# Altium footprint library ICs And Semiconductors SMD.PcbLib: 943 footprints (part 12 of 60)
Each footprint in its own frame and in the unit in brackets; x right, y up, seen from the top. Pads: shape width x height; smd on the part's side, far side on the other; paste and mask are expansions set on the pad; w line width, h text height; cw(c..) or ccw(c..) is an arc to the next point about the centre after c.
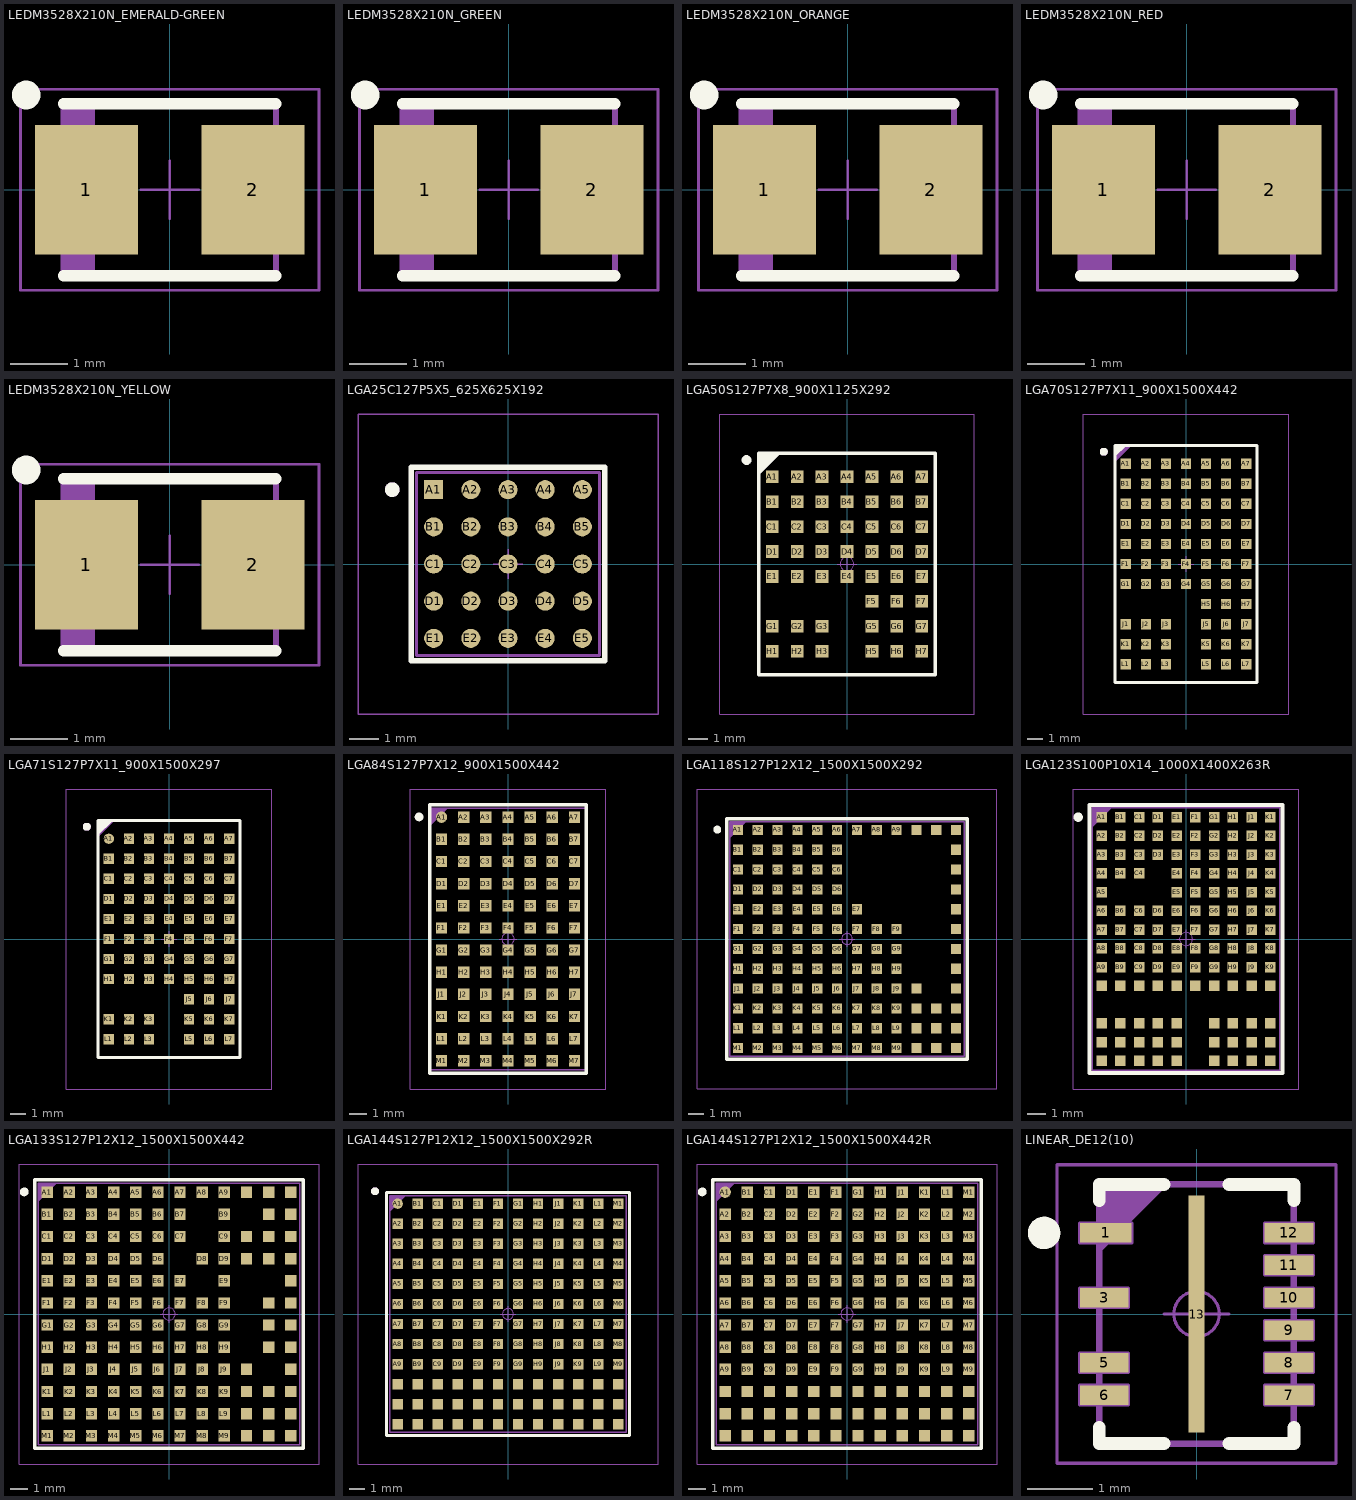
[diagram p11: the footprints below, top view; thin cyan lines are the x and y axes]

## LEDM3528X210N_EMERALD-GREEN [mm] "Molded SMD Emerald Green LED, 2-Leads, Body 3.5x2.8mm, IPC Medium Density"
height 2.1
pads (2):
  rect 1.8x2.25 smd: 1(-1.45,0) 2(1.45,0)
Top Overlay:
  circle w0.25: c-2.5,1.65 r0.125
  lines w0.2: -1.85,-1.5 1.85,-1.5 ; -1.85,1.5 1.85,1.5
Mechanical 14:
  lines w0.1: -1.8,-1.5 -1.8,1.5 ; -1.725,-1.5 -1.725,1.5 ; -1.65,-1.5 -1.65,1.5 ; -1.575,-1.5 -1.575,1.5 ; -1.5,-1.5 -1.5,1.5 ; -1.425,-1.5 -1.425,1.5 ; -1.35,-1.5 -1.35,1.5 ; -1.85,-1.5 -1.85,1.5 1.85,1.5 1.85,-1.5 -1.85,-1.5
Mechanical 15:
  lines w0.05: -0.5,0 0.5,0 ; 0,-0.5 0,0.5 ; -2.6,-1.75 -2.6,1.75 2.6,1.75 2.6,-1.75 -2.6,-1.75
3D body "LEDM3528X210N_EMERALD-GREEN.stp": height 2.1, standoff 0, extent -1.85,-1.5 1.85,1.5

## LEDM3528X210N_GREEN [mm] "Molded SMD Green LED, 2-Leads, Body 3.5x2.8mm, IPC Medium Density"
height 2.1
pads (2):
  rect 1.8x2.25 smd: 1(-1.45,0) 2(1.45,0)
Top Overlay:
  circle w0.25: c-2.5,1.65 r0.125
  lines w0.2: -1.85,-1.5 1.85,-1.5 ; -1.85,1.5 1.85,1.5
Mechanical 14:
  lines w0.1: -1.8,-1.5 -1.8,1.5 ; -1.725,-1.5 -1.725,1.5 ; -1.65,-1.5 -1.65,1.5 ; -1.575,-1.5 -1.575,1.5 ; -1.5,-1.5 -1.5,1.5 ; -1.425,-1.5 -1.425,1.5 ; -1.35,-1.5 -1.35,1.5 ; -1.85,-1.5 -1.85,1.5 1.85,1.5 1.85,-1.5 -1.85,-1.5
Mechanical 15:
  lines w0.05: -0.5,0 0.5,0 ; 0,-0.5 0,0.5 ; -2.6,-1.75 -2.6,1.75 2.6,1.75 2.6,-1.75 -2.6,-1.75
3D body "LEDM3528X210N_GREEN.stp": height 2.1, standoff 0, extent -1.85,-1.5 1.85,1.5

## LEDM3528X210N_ORANGE [mm] "Molded SMD ORANGE LED, 2-Leads, Body 3.5x2.8mm, IPC Medium Density"
height 2.1
pads (2):
  rect 1.8x2.25 smd: 1(-1.45,0) 2(1.45,0)
Top Overlay:
  circle w0.25: c-2.5,1.65 r0.125
  lines w0.2: -1.85,-1.5 1.85,-1.5 ; -1.85,1.5 1.85,1.5
Mechanical 14:
  lines w0.1: -1.8,-1.5 -1.8,1.5 ; -1.725,-1.5 -1.725,1.5 ; -1.65,-1.5 -1.65,1.5 ; -1.575,-1.5 -1.575,1.5 ; -1.5,-1.5 -1.5,1.5 ; -1.425,-1.5 -1.425,1.5 ; -1.35,-1.5 -1.35,1.5 ; -1.85,-1.5 -1.85,1.5 1.85,1.5 1.85,-1.5 -1.85,-1.5
Mechanical 15:
  lines w0.05: -0.5,0 0.5,0 ; 0,-0.5 0,0.5 ; -2.6,-1.75 -2.6,1.75 2.6,1.75 2.6,-1.75 -2.6,-1.75
3D body "LEDM3528X210N_ORANGE.stp": height 2.1, standoff 0, extent -1.85,-1.5 1.85,1.5

## LEDM3528X210N_RED [mm] "Molded SMD RED LED, 2-Leads, Body 3.5x2.8mm, IPC Medium Density"
height 2.1
pads (2):
  rect 1.8x2.25 smd: 1(-1.45,0) 2(1.45,0)
Top Overlay:
  circle w0.25: c-2.5,1.65 r0.125
  lines w0.2: -1.85,-1.5 1.85,-1.5 ; -1.85,1.5 1.85,1.5
Mechanical 14:
  lines w0.1: -1.8,-1.5 -1.8,1.5 ; -1.725,-1.5 -1.725,1.5 ; -1.65,-1.5 -1.65,1.5 ; -1.575,-1.5 -1.575,1.5 ; -1.5,-1.5 -1.5,1.5 ; -1.425,-1.5 -1.425,1.5 ; -1.35,-1.5 -1.35,1.5 ; -1.85,-1.5 1.85,-1.5 1.85,1.5 -1.85,1.5 -1.85,-1.5
Mechanical 15:
  lines w0.05: -0.5,0 0.5,0 ; 0,-0.5 0,0.5 ; -2.6,-1.75 2.6,-1.75 2.6,1.75 -2.6,1.75 -2.6,-1.75
3D body "LEDM3528X210N_RED.stp": height 2.1, standoff 0, extent -1.85,-1.5 1.85,1.5

## LEDM3528X210N_YELLOW [mm] "Molded SMD YELLOW LED, 2-Leads, Body 3.5x2.8mm, IPC Medium Density"
height 2.1
pads (2):
  rect 1.8x2.25 smd: 1(-1.45,0) 2(1.45,0)
Top Overlay:
  circle w0.25: c-2.5,1.65 r0.125
  lines w0.2: -1.85,-1.5 1.85,-1.5 ; -1.85,1.5 1.85,1.5
Mechanical 14:
  lines w0.1: -1.8,-1.5 -1.8,1.5 ; -1.725,-1.5 -1.725,1.5 ; -1.65,-1.5 -1.65,1.5 ; -1.575,-1.5 -1.575,1.5 ; -1.5,-1.5 -1.5,1.5 ; -1.425,-1.5 -1.425,1.5 ; -1.35,-1.5 -1.35,1.5 ; -1.85,-1.5 -1.85,1.5 1.85,1.5 1.85,-1.5 -1.85,-1.5
Mechanical 15:
  lines w0.05: -0.5,0 0.5,0 ; 0,-0.5 0,0.5 ; -2.6,-1.75 -2.6,1.75 2.6,1.75 2.6,-1.75 -2.6,-1.75
3D body "LEDM3528X210N_YELLOW.stp": height 2.1, standoff 0, extent -1.85,-1.5 1.85,1.5

## LGA25C127P5X5_625X625X192 [mm] "LGA, 1.27mm Pitch, Square; 25 Pin, 5 Columns X 5 Rows, 6.25mm X 6.25mm X 1.92mm H"
height 1.92
pads (25):
  rect 0.65x0.65 smd: A1(-2.54,2.54)
  round 0.65 smd: A2(-1.27,2.54) A3(0,2.54) A4(1.27,2.54) A5(2.54,2.54) B1(-2.54,1.27) B2(-1.27,1.27) B3(0,1.27) B4(1.27,1.27) B5(2.54,1.27) C1(-2.54,0) C2(-1.27,0) C3(0,0) C4(1.27,0) C5(2.54,0) D1(-2.54,-1.27) D2(-1.27,-1.27) D3(0,-1.27) D4(1.27,-1.27) D5(2.54,-1.27) E1(-2.54,-2.54) E2(-1.27,-2.54) E3(0,-2.54) E4(1.27,-2.54) E5(2.54,-2.54)
Top Overlay:
  circle w0.25: c-3.955,2.54 r0.125
  lines w0.2: -3.305,-3.305 3.305,-3.305 3.305,3.305 -3.305,3.305 -3.305,-3.305
Mechanical 14:
  circle w0.25: c-3.955,2.54 r0.125
  lines w0.1: -3.125,-3.125 -3.125,3.125 3.125,3.125 3.125,-3.125 -3.125,-3.125
  text "1" at -2.6,3.5 h0.4
  text "2" at -1.4,3.5 h0.4
  text "3" at -0.14,3.5 h0.4
  text "4" at 1.12,3.5 h0.4
  text "5" at 2.4,3.5 h0.4
  text "E" at -3.8,-2.74 h0.4
  text "D" at -3.8,-1.47 h0.4
  text "C" at -3.8,-0.2 h0.4
  text "B" at -3.8,1.07 h0.4
  text "A" at -3.8,2.34 h0.4
Mechanical 15:
  lines w0.05: -0.5,0 0.5,0 ; 0,-0.5 0,0.5 ; -5.125,-5.125 -5.125,5.125 5.125,5.125 5.125,-5.125 -5.125,-5.125
3D body "LGA25C127P5X5_625X625X192.stp": height 1.92, standoff 0, extent -3.125,-3.125 3.125,3.125

## LGA50S127P7X8_900X1125X292 [mm] "LGA, 1.27mm pitch,rect.; 50 pin,7 columns X 8 rows, 9.00mm X 11.25mm X 2.92mm H"
height 2.92
pads (50):
  rect 0.65x0.65 smd: A1(-3.81,4.445) A2(-2.54,4.445) A3(-1.27,4.445) A4(0,4.445) A5(1.27,4.445) A6(2.54,4.445) A7(3.81,4.445) B1(-3.81,3.175) B2(-2.54,3.175) B3(-1.27,3.175) B4(0,3.175) B5(1.27,3.175) B6(2.54,3.175) B7(3.81,3.175) C1(-3.81,1.905) C2(-2.54,1.905) C3(-1.27,1.905) C4(0,1.905) C5(1.27,1.905) C6(2.54,1.905) C7(3.81,1.905) D1(-3.81,0.635) D2(-2.54,0.635) D3(-1.27,0.635) D4(0,0.635) D5(1.27,0.635) D6(2.54,0.635) D7(3.81,0.635) E1(-3.81,-0.635) E2(-2.54,-0.635) E3(-1.27,-0.635) E4(0,-0.635) E5(1.27,-0.635) E6(2.54,-0.635) E7(3.81,-0.635) F5(1.27,-1.905) F6(2.54,-1.905) F7(3.81,-1.905) G1(-3.81,-3.175) G2(-2.54,-3.175) G3(-1.27,-3.175) G5(1.27,-3.175) G6(2.54,-3.175) G7(3.81,-3.175) H1(-3.81,-4.445) H2(-2.54,-4.445) H3(-1.27,-4.445) H5(1.27,-4.445) H6(2.54,-4.445) H7(3.81,-4.445)
Top Overlay:
  circle w0.25: c-5.125,5.3 r0.125
  lines w0.2: -4.5,4.65 -3.5,5.65 ; -4.5,4.85 -3.7,5.65 ; -4.5,5.05 -3.9,5.65 ; -4.5,5.25 -4.1,5.65 ; -4.5,5.45 -4.3,5.65 ; -4.5,-5.65 -4.5,5.65 4.5,5.65 4.5,-5.65 -4.5,-5.65
Mechanical 14:
  lines w0.1: -4.5,4.65 -3.5,5.65 ; -4.5,4.75 -3.6,5.65 ; -4.5,4.85 -3.7,5.65 ; -4.5,4.95 -3.8,5.65 ; -4.5,5.05 -3.9,5.65 ; -4.5,5.15 -4,5.65 ; -4.5,5.25 -4.1,5.65 ; -4.5,5.35 -4.2,5.65 ; -4.5,5.45 -4.3,5.65 ; -4.5,5.55 -4.4,5.65 ; -4.5,-5.625 -4.5,5.625 4.5,5.625 4.5,-5.625 -4.5,-5.625
  text "6" at 2.477,5.988 h0.4
  text "5" at 1.207,5.988 h0.4
  text "4" at -0.063,5.988 h0.4
  text "7" at 3.747,5.988 h0.4
  text "3" at -1.333,5.988 h0.4
  text "2" at -2.603,5.988 h0.4
  text "1" at -3.873,5.988 h0.4
  text "A" at -5.016,4.337 h0.4
  text "B" at -5.016,3.067 h0.4
  text "C" at -5.016,1.797 h0.4
  text "D" at -5.016,0.527 h0.4
  text "E" at -5.016,-0.743 h0.4
  text "F" at -5.016,-2.013 h0.4
  text "G" at -5.016,-3.283 h0.4
  text "H" at -5.016,-4.553 h0.4
Mechanical 15:
  circle w0.05: c0,0 r0.35
  lines w0.05: -0.5,0 0.5,0 ; 0,-0.5 0,0.5 ; -6.5,-7.65 -6.5,7.65 6.5,7.65 6.5,-7.65 -6.5,-7.65
3D body "LGA50S127P7X8_900X1125X292.stp": height 2.92, standoff 0, extent -4.5,-5.625 4.5,5.625

## LGA70S127P7X11_900X1500X442 [mm] "LGA, 1.27mm pitch, rect., 70 pin, 7 columns X 11 rows, 9mm X 15mm X 4.42mm H"
height 4.42
pads (70):
  rect 0.65x0.65 smd: A1(-3.81,6.35) A2(-2.54,6.35) A3(-1.27,6.35) A4(0,6.35) A5(1.27,6.35) A6(2.54,6.35) A7(3.81,6.35) B1(-3.81,5.08) B2(-2.54,5.08) B3(-1.27,5.08) B4(0,5.08) B5(1.27,5.08) B6(2.54,5.08) B7(3.81,5.08) C1(-3.81,3.81) C2(-2.54,3.81) C3(-1.27,3.81) C4(0,3.81) C5(1.27,3.81) C6(2.54,3.81) C7(3.81,3.81) D1(-3.81,2.54) D2(-2.54,2.54) D3(-1.27,2.54) D4(0,2.54) D5(1.27,2.54) D6(2.54,2.54) D7(3.81,2.54) E1(-3.81,1.27) E2(-2.54,1.27) E3(-1.27,1.27) E4(0,1.27) E5(1.27,1.27) E6(2.54,1.27) E7(3.81,1.27) F1(-3.81,0) F2(-2.54,0) F3(-1.27,0) F4(0,0) F5(1.27,0) F6(2.54,0) F7(3.81,0) G1(-3.81,-1.27) G2(-2.54,-1.27) G3(-1.27,-1.27) G4(0,-1.27) G5(1.27,-1.27) G6(2.54,-1.27) G7(3.81,-1.27) H5(1.27,-2.54) H6(2.54,-2.54) H7(3.81,-2.54) J1(-3.81,-3.81) J2(-2.54,-3.81) J3(-1.27,-3.81) J5(1.27,-3.81) J6(2.54,-3.81) J7(3.81,-3.81) K1(-3.81,-5.08) K2(-2.54,-5.08) K3(-1.27,-5.08) K5(1.27,-5.08) K6(2.54,-5.08) K7(3.81,-5.08) L1(-3.81,-6.35) L2(-2.54,-6.35) L3(-1.27,-6.35) L5(1.27,-6.35) L6(2.54,-6.35) L7(3.81,-6.35)
Top Overlay:
  circle w0.25: c-5.205,7.112 r0.125
  lines w0.2: -4.5,6.9 -3.9,7.5 ; -4.5,7.1 -4.1,7.5 ; -4.5,7.3 -4.3,7.5 ; -4.5,-7.5 4.5,-7.5 4.5,7.5 -4.5,7.5 -4.5,-7.5
Mechanical 14:
  circle w0.25: c-5.205,7.112 r0.125
  lines w0.1: -4.5,6.5 -3.5,7.5 ; -4.5,6.6 -3.6,7.5 ; -4.5,6.7 -3.7,7.5 ; -4.5,6.8 -3.8,7.5 ; -4.5,6.9 -3.9,7.5 ; -4.5,7 -4,7.5 ; -4.5,7.1 -4.1,7.5 ; -4.5,7.2 -4.2,7.5 ; -4.5,7.3 -4.3,7.5 ; -4.5,7.4 -4.4,7.5 ; -4.5,-7.5 -4.5,7.5 4.5,7.5 4.5,-7.5 -4.5,-7.5
  text "6" at 2.413,7.874 h0.4
  text "5" at 1.143,7.874 h0.4
  text "4" at -0.127,7.874 h0.4
  text "7" at 3.683,7.874 h0.4
  text "3" at -1.397,7.874 h0.4
  text "2" at -2.667,7.874 h0.4
  text "1" at -3.937,7.874 h0.4
  text "J" at -5.08,-3.937 h0.4
  text "A" at -5.08,6.223 h0.4
  text "B" at -5.08,4.953 h0.4
  text "C" at -5.08,3.683 h0.4
  text "D" at -5.08,2.413 h0.4
  text "E" at -5.08,1.143 h0.4
  text "F" at -5.08,-0.127 h0.4
  text "G" at -5.08,-1.397 h0.4
  text "H" at -5.08,-2.667 h0.4
  text "K" at -5.08,-5.207 h0.4
  text "L" at -5.08,-6.477 h0.4
Mechanical 15:
  lines w0.05: -0.5,0 0.5,0 ; 0,-0.5 0,0.5 ; -6.5,-9.5 -6.5,9.5 6.5,9.5 6.5,-9.5 -6.5,-9.5
3D body "LGA70S127P7X11_900X1500X442.stp": height 4.42, standoff 0, extent -4.5,-7.5 4.5,7.5

## LGA71S127P7X11_900X1500X297 [mm] "LGA, 1.27mm pitch, rect., 71 pin, 7 columns X 11 rows, 9mm X 15mm X 2.97mm H"
height 2.97
pads (71):
  round 0.65 smd: A1(-3.81,6.35)
  rect 0.65x0.65 smd: A2(-2.54,6.35) A3(-1.27,6.35) A4(0,6.35) A5(1.27,6.35) A6(2.54,6.35) A7(3.81,6.35) B1(-3.81,5.08) B2(-2.54,5.08) B3(-1.27,5.08) B4(0,5.08) B5(1.27,5.08) B6(2.54,5.08) B7(3.81,5.08) C1(-3.81,3.81) C2(-2.54,3.81) C3(-1.27,3.81) C4(0,3.81) C5(1.27,3.81) C6(2.54,3.81) C7(3.81,3.81) D1(-3.81,2.54) D2(-2.54,2.54) D3(-1.27,2.54) D4(0,2.54) D5(1.27,2.54) D6(2.54,2.54) D7(3.81,2.54) E1(-3.81,1.27) E2(-2.54,1.27) E3(-1.27,1.27) E4(0,1.27) E5(1.27,1.27) E6(2.54,1.27) E7(3.81,1.27) F1(-3.81,0) F2(-2.54,0) F3(-1.27,0) F4(0,0) F5(1.27,0) F6(2.54,0) F7(3.81,0) G1(-3.81,-1.27) G2(-2.54,-1.27) G3(-1.27,-1.27) G4(0,-1.27) G5(1.27,-1.27) G6(2.54,-1.27) G7(3.81,-1.27) H1(-3.81,-2.54) H2(-2.54,-2.54) H3(-1.27,-2.54) H4(0,-2.54) H5(1.27,-2.54) H6(2.54,-2.54) H7(3.81,-2.54) J5(1.27,-3.81) J6(2.54,-3.81) J7(3.81,-3.81) K1(-3.81,-5.08) K2(-2.54,-5.08) K3(-1.27,-5.08) K5(1.27,-5.08) K6(2.54,-5.08) K7(3.81,-5.08) L1(-3.81,-6.35) L2(-2.54,-6.35) L3(-1.27,-6.35) L5(1.27,-6.35) L6(2.54,-6.35) L7(3.81,-6.35)
Top Overlay:
  circle w0.25: c-5.205,7.112 r0.125
  lines w0.2: -4.5,6.7 -3.7,7.5 ; -4.5,6.9 -3.9,7.5 ; -4.5,7.1 -4.1,7.5 ; -4.5,7.3 -4.3,7.5 ; -4.5,-7.5 4.5,-7.5 4.5,7.5 -4.5,7.5 -4.5,-7.5
Mechanical 14:
  circle w0.25: c-5.205,7.112 r0.125
  lines w0.1: -4.5,6.5 -3.5,7.5 ; -4.5,6.6 -3.6,7.5 ; -4.5,6.7 -3.7,7.5 ; -4.5,6.8 -3.8,7.5 ; -4.5,6.9 -3.9,7.5 ; -4.5,7 -4,7.5 ; -4.5,7.1 -4.1,7.5 ; -4.5,7.2 -4.2,7.5 ; -4.5,7.3 -4.3,7.5 ; -4.5,7.4 -4.4,7.5 ; -4.5,-7.5 -4.5,7.5 4.5,7.5 4.5,-7.5 -4.5,-7.5
  text "6" at 2.413,7.874 h0.4
  text "5" at 1.143,7.874 h0.4
  text "4" at -0.127,7.874 h0.4
  text "7" at 3.683,7.874 h0.4
  text "3" at -1.397,7.874 h0.4
  text "2" at -2.667,7.874 h0.4
  text "1" at -3.937,7.874 h0.4
  text "J" at -5.08,-3.937 h0.4
  text "A" at -5.08,6.223 h0.4
  text "B" at -5.08,4.953 h0.4
  text "C" at -5.08,3.683 h0.4
  text "D" at -5.08,2.413 h0.4
  text "E" at -5.08,1.143 h0.4
  text "F" at -5.08,-0.127 h0.4
  text "G" at -5.08,-1.397 h0.4
  text "H" at -5.08,-2.667 h0.4
  text "K" at -5.08,-5.207 h0.4
  text "L" at -5.08,-6.477 h0.4
Mechanical 15:
  lines w0.05: -0.5,0 0.5,0 ; 0,-0.5 0,0.5 ; -6.5,-9.5 -6.5,9.5 6.5,9.5 6.5,-9.5 -6.5,-9.5
3D body "LGA71S127P7X11_900X1500X297.stp": height 2.97, standoff 0, extent -4.5,-7.5 4.5,7.5

## LGA84S127P7X12_900X1500X442 [mm] "LGA, 1.27mm Pitch, Rect.; 84 Pin, 7 Columns X 12 Rows, 9.00mm X 15.00mm X 4.42mm H"
height 4.42
pads (84):
  round 0.65 smd: A1(-3.81,6.985)
  rect 0.65x0.65 smd: A2(-2.54,6.985) A3(-1.27,6.985) A4(0,6.985) A5(1.27,6.985) A6(2.54,6.985) A7(3.81,6.985) B1(-3.81,5.715) B2(-2.54,5.715) B3(-1.27,5.715) B4(0,5.715) B5(1.27,5.715) B6(2.54,5.715) B7(3.81,5.715) C1(-3.81,4.445) C2(-2.54,4.445) C3(-1.27,4.445) C4(0,4.445) C5(1.27,4.445) C6(2.54,4.445) C7(3.81,4.445) D1(-3.81,3.175) D2(-2.54,3.175) D3(-1.27,3.175) D4(0,3.175) D5(1.27,3.175) D6(2.54,3.175) D7(3.81,3.175) E1(-3.81,1.905) E2(-2.54,1.905) E3(-1.27,1.905) E4(0,1.905) E5(1.27,1.905) E6(2.54,1.905) E7(3.81,1.905) F1(-3.81,0.635) F2(-2.54,0.635) F3(-1.27,0.635) F4(0,0.635) F5(1.27,0.635) F6(2.54,0.635) F7(3.81,0.635) G1(-3.81,-0.635) G2(-2.54,-0.635) G3(-1.27,-0.635) G4(0,-0.635) G5(1.27,-0.635) G6(2.54,-0.635) G7(3.81,-0.635) H1(-3.81,-1.905) H2(-2.54,-1.905) H3(-1.27,-1.905) H4(0,-1.905) H5(1.27,-1.905) H6(2.54,-1.905) H7(3.81,-1.905) J1(-3.81,-3.175) J2(-2.54,-3.175) J3(-1.27,-3.175) J4(0,-3.175) J5(1.27,-3.175) J6(2.54,-3.175) J7(3.81,-3.175) K1(-3.81,-4.445) K2(-2.54,-4.445) K3(-1.27,-4.445) K4(0,-4.445) K5(1.27,-4.445) K6(2.54,-4.445) K7(3.81,-4.445) L1(-3.81,-5.715) L2(-2.54,-5.715) L3(-1.27,-5.715) L4(0,-5.715) L5(1.27,-5.715) L6(2.54,-5.715) L7(3.81,-5.715) M1(-3.81,-6.985) M2(-2.54,-6.985) M3(-1.27,-6.985) M4(0,-6.985) M5(1.27,-6.985) M6(2.54,-6.985) M7(3.81,-6.985)
Top Overlay:
  circle w0.25: c-5.1,7 r0.125
  lines w0.2: -4.5,-7.7 4.5,-7.7 4.5,7.7 -4.5,7.7 -4.5,-7.7
Mechanical 14:
  lines w0.1: -4.5,6.5 -3.5,7.5 ; -4.5,6.6 -3.6,7.5 ; -4.5,6.7 -3.7,7.5 ; -4.5,6.8 -3.8,7.5 ; -4.5,6.9 -3.9,7.5 ; -4.5,7 -4,7.5 ; -4.5,7.1 -4.1,7.5 ; -4.5,7.2 -4.2,7.5 ; -4.5,7.3 -4.3,7.5 ; -4.5,7.4 -4.4,7.5 ; -4.5,-7.5 4.5,-7.5 4.5,7.5 -4.5,7.5 -4.5,-7.5
  text "M" at -5.08,-7.112 h0.4
  text "L" at -5.08,-5.842 h0.4
  text "K" at -5.08,-4.572 h0.4
  text "H" at -5.08,-2.032 h0.4
  text "G" at -5.08,-0.762 h0.4
  text "F" at -5.08,0.508 h0.4
  text "E" at -5.08,1.778 h0.4
  text "D" at -5.08,3.048 h0.4
  text "C" at -5.08,4.318 h0.4
  text "B" at -5.08,5.588 h0.4
  text "A" at -5.08,6.858 h0.4
  text "J" at -5.08,-3.302 h0.4
  text "1" at -3.927,7.999 h0.4
  text "2" at -2.657,7.999 h0.4
  text "3" at -1.387,7.999 h0.4
  text "7" at 3.693,7.999 h0.4
  text "4" at -0.117,7.999 h0.4
  text "5" at 1.153,7.999 h0.4
  text "6" at 2.423,7.999 h0.4
Mechanical 15:
  circle w0.05: c0,0 r0.35
  lines w0.05: -0.5,0 0.5,0 ; 0,-0.5 0,0.5 ; -5.6,-8.6 5.6,-8.6 5.6,8.6 -5.6,8.6 -5.6,-8.6
3D body "LGA84S127P7X12_900X1500X442.stp": height 4.42, standoff 0, extent -4.5,-7.5 4.5,7.5

## LGA118S127P12X12_1500X1500X292 [mm] "LGA,1.27mm Pitch,Square;118 Pin,12 Columns X 12 Rows,15.00mm X 15.00mm X 2.92mm H"
height 2.92
pads (118):
  rect 0.65x0.65 smd: A1(-6.985,6.985) A2(-5.715,6.985) A3(-4.445,6.985) A4(-3.175,6.985) A5(-1.905,6.985) A6(-0.635,6.985) A7(0.635,6.985) A8(1.905,6.985) A9(3.175,6.985) A10(4.445,6.985) A11(5.715,6.985) A12(6.985,6.985) B1(-6.985,5.715) B2(-5.715,5.715) B3(-4.445,5.715) B4(-3.175,5.715) B5(-1.905,5.715) B6(-0.635,5.715) B12(6.985,5.715) C1(-6.985,4.445) C2(-5.715,4.445) C3(-4.445,4.445) C4(-3.175,4.445) C5(-1.905,4.445) C6(-0.635,4.445) C12(6.985,4.445) D1(-6.985,3.175) D2(-5.715,3.175) D3(-4.445,3.175) D4(-3.175,3.175) D5(-1.905,3.175) D6(-0.635,3.175) D12(6.985,3.175) E1(-6.985,1.905) E2(-5.715,1.905) E3(-4.445,1.905) E4(-3.175,1.905) E5(-1.905,1.905) E6(-0.635,1.905) E7(0.635,1.905) E12(6.985,1.905) F1(-6.985,0.635) F2(-5.715,0.635) F3(-4.445,0.635) F4(-3.175,0.635) F5(-1.905,0.635) F6(-0.635,0.635) F7(0.635,0.635) F8(1.905,0.635) F9(3.175,0.635) F12(6.985,0.635) G1(-6.985,-0.635) G2(-5.715,-0.635) G3(-4.445,-0.635) G4(-3.175,-0.635) G5(-1.905,-0.635) G6(-0.635,-0.635) G7(0.635,-0.635) G8(1.905,-0.635) G9(3.175,-0.635) G12(6.985,-0.635) H1(-6.985,-1.905) H2(-5.715,-1.905) H3(-4.445,-1.905) H4(-3.175,-1.905) H5(-1.905,-1.905) H6(-0.635,-1.905) H7(0.635,-1.905) H8(1.905,-1.905) H9(3.175,-1.905) H12(6.985,-1.905) J1(-6.985,-3.175) J2(-5.715,-3.175) J3(-4.445,-3.175) J4(-3.175,-3.175) J5(-1.905,-3.175) J6(-0.635,-3.175) J7(0.635,-3.175) J8(1.905,-3.175) J9(3.175,-3.175) J10(4.445,-3.175) J12(6.985,-3.175) K1(-6.985,-4.445) K2(-5.715,-4.445) K3(-4.445,-4.445) K4(-3.175,-4.445) K5(-1.905,-4.445) K6(-0.635,-4.445) K7(0.635,-4.445) K8(1.905,-4.445) K9(3.175,-4.445) K10(4.445,-4.445) K11(5.715,-4.445) K12(6.985,-4.445) L1(-6.985,-5.715) L2(-5.715,-5.715) L3(-4.445,-5.715) L4(-3.175,-5.715) L5(-1.905,-5.715) L6(-0.635,-5.715) L7(0.635,-5.715) L8(1.905,-5.715) L9(3.175,-5.715) L10(4.445,-5.715) L11(5.715,-5.715) L12(6.985,-5.715) M1(-6.985,-6.985) M2(-5.715,-6.985) M3(-4.445,-6.985) M4(-3.175,-6.985) M5(-1.905,-6.985) M6(-0.635,-6.985) M7(0.635,-6.985) M8(1.905,-6.985) M9(3.175,-6.985) M10(4.445,-6.985) M11(5.715,-6.985) M12(6.985,-6.985)
Top Overlay:
  circle w0.25: c-8.3,7 r0.125
  lines w0.2: -7.7,-7.7 -7.7,7.7 7.7,7.7 7.7,-7.7 -7.7,-7.7
Mechanical 14:
  lines w0.1: -7.5,6.5 -6.5,7.5 ; -7.5,6.6 -6.6,7.5 ; -7.5,6.7 -6.7,7.5 ; -7.5,6.8 -6.8,7.5 ; -7.5,6.9 -6.9,7.5 ; -7.5,7 -7,7.5 ; -7.5,7.1 -7.1,7.5 ; -7.5,7.2 -7.2,7.5 ; -7.5,7.3 -7.3,7.5 ; -7.5,7.4 -7.4,7.5 ; -7.5,-7.5 -7.5,7.5 7.5,7.5 7.5,-7.5 -7.5,-7.5
  text "L" at -8.055,-7.137 h0.4
  text "K" at -8.055,-5.867 h0.4
  text "J" at -8.055,-4.597 h0.4
  text "I" at -7.926,-3.302 h0.4
  text "H" at -8.001,-2.032 h0.4
  text "A" at -8.001,6.858 h0.4
  text "B" at -8.001,5.588 h0.4
  text "C" at -8.001,4.318 h0.4
  text "G" at -8.001,-0.762 h0.4
  text "D" at -8.001,3.048 h0.4
  text "E" at -8.001,1.778 h0.4
  text "F" at -8.001,0.508 h0.4
  text "12" at 6.858,7.747 h0.4
  text "11" at 5.588,7.747 h0.4
  text "10" at 4.318,7.747 h0.4
  text "8" at 1.778,7.747 h0.4
  text "7" at 0.508,7.747 h0.4
  text "6" at -0.762,7.747 h0.4
  text "5" at -2.032,7.747 h0.4
  text "4" at -3.302,7.747 h0.4
  text "3" at -4.572,7.747 h0.4
  text "2" at -5.842,7.747 h0.4
  text "1" at -7.112,7.747 h0.4
  text "9" at 3.048,7.747 h0.4
Mechanical 15:
  circle w0.05: c0,0 r0.35
  lines w0.05: -0.5,0 0.5,0 ; 0,-0.5 0,0.5 ; -9.6,-9.6 -9.6,9.6 9.6,9.6 9.6,-9.6 -9.6,-9.6
3D body "LGA118S127P12X12_1500X1500X292.stp": height 2.92, standoff 0, extent -7.5,-7.5 7.5,7.5

## LGA123S100P10X14_1000X1400X263R [mm] "LGA, 1.00mm pitch,rect.; 123 pin, 10 columns X 14 rows, 10.00mm X 14.00mm X 2.63mm H (w/Reversed Pins)"
height 2.63
pads (123):
  rect 0.55x0.55 smd: A1(-4.5,6.5) A2(-4.5,5.5) A3(-4.5,4.5) A4(-4.5,3.5) A5(-4.5,2.5) A6(-4.5,1.5) A7(-4.5,0.5) A8(-4.5,-0.5) A9(-4.5,-1.5) A10(-4.5,-2.5) A12(-4.5,-4.5) A13(-4.5,-5.5) A14(-4.5,-6.5) B1(-3.5,6.5) B2(-3.5,5.5) B3(-3.5,4.5) B4(-3.5,3.5) B6(-3.5,1.5) B7(-3.5,0.5) B8(-3.5,-0.5) B9(-3.5,-1.5) B10(-3.5,-2.5) B12(-3.5,-4.5) B13(-3.5,-5.5) B14(-3.5,-6.5) C1(-2.5,6.5) C2(-2.5,5.5) C3(-2.5,4.5) C4(-2.5,3.5) C6(-2.5,1.5) C7(-2.5,0.5) C8(-2.5,-0.5) C9(-2.5,-1.5) C10(-2.5,-2.5) C12(-2.5,-4.5) C13(-2.5,-5.5) C14(-2.5,-6.5) D1(-1.5,6.5) D2(-1.5,5.5) D3(-1.5,4.5) D6(-1.5,1.5) D7(-1.5,0.5) D8(-1.5,-0.5) D9(-1.5,-1.5) D10(-1.5,-2.5) D12(-1.5,-4.5) D13(-1.5,-5.5) D14(-1.5,-6.5) E1(-0.5,6.5) E2(-0.5,5.5) E3(-0.5,4.5) E4(-0.5,3.5) E5(-0.5,2.5) E6(-0.5,1.5) E7(-0.5,0.5) E8(-0.5,-0.5) E9(-0.5,-1.5) E10(-0.5,-2.5) E12(-0.5,-4.5) E13(-0.5,-5.5) E14(-0.5,-6.5) F1(0.5,6.5) F2(0.5,5.5) F3(0.5,4.5) F4(0.5,3.5) F5(0.5,2.5) F6(0.5,1.5) F7(0.5,0.5) F8(0.5,-0.5) F9(0.5,-1.5) F10(0.5,-2.5) G1(1.5,6.5) G2(1.5,5.5) G3(1.5,4.5) G4(1.5,3.5) G5(1.5,2.5) G6(1.5,1.5) G7(1.5,0.5) G8(1.5,-0.5) G9(1.5,-1.5) G10(1.5,-2.5) G12(1.5,-4.5) G13(1.5,-5.5) G14(1.5,-6.5) H1(2.5,6.5) H2(2.5,5.5) H3(2.5,4.5) H4(2.5,3.5) H5(2.5,2.5) H6(2.5,1.5) H7(2.5,0.5) H8(2.5,-0.5) H9(2.5,-1.5) H10(2.5,-2.5) H12(2.5,-4.5) H13(2.5,-5.5) H14(2.5,-6.5) J1(3.5,6.5) J2(3.5,5.5) J3(3.5,4.5) J4(3.5,3.5) J5(3.5,2.5) J6(3.5,1.5) J7(3.5,0.5) J8(3.5,-0.5) J9(3.5,-1.5) J10(3.5,-2.5) J12(3.5,-4.5) J13(3.5,-5.5) J14(3.5,-6.5) K1(4.5,6.5) K2(4.5,5.5) K3(4.5,4.5) K4(4.5,3.5) K5(4.5,2.5) K6(4.5,1.5) K7(4.5,0.5) K8(4.5,-0.5) K9(4.5,-1.5) K10(4.5,-2.5) K12(4.5,-4.5) K13(4.5,-5.5) K14(4.5,-6.5)
Top Overlay:
  circle w0.25: c-5.75,6.5 r0.125
  lines w0.2: -5.15,-7.15 5.15,-7.15 5.15,7.15 -5.15,7.15 -5.15,-7.15
Mechanical 14:
  lines w0.1: -5,6 -4,7 ; -5,6.1 -4.1,7 ; -5,6.2 -4.2,7 ; -5,6.3 -4.3,7 ; -5,6.4 -4.4,7 ; -5,6.5 -4.5,7 ; -5,6.6 -4.6,7 ; -5,6.7 -4.7,7 ; -5,6.8 -4.8,7 ; -5,6.9 -4.9,7 ; -5,-7 5,-7 5,7 -5,7 -5,-7
  text "1" at -5.775,6.3 h0.6
  text "A" at -4.275,7.475 h0.6
  text "14" at -6.35,-6.825 h0.6
  text "K" at 4.725,7.475 h0.6
Mechanical 15:
  circle w0.05: c0,0 r0.35
  lines w0.05: -0.5,0 0.5,0 ; 0,-0.5 0,0.5 ; -6,-8 6,-8 6,8 -6,8 -6,-8
3D body "LGA123S100P10X14_1000X1400X263R.stp": height 2.63, standoff 0, extent -5,-7 5,7

## LGA133S127P12X12_1500X1500X442 [mm] "LGA, 1.27mm Pitch, Square; 133 Pin, 12 Columns X 12 Rows, 15.00mm X 15.00mm X 4.42mm H"
height 4.42
pads (133):
  rect 0.65x0.65 smd: A1(-6.985,6.985) A2(-5.715,6.985) A3(-4.445,6.985) A4(-3.175,6.985) A5(-1.905,6.985) A6(-0.635,6.985) A7(0.635,6.985) A8(1.905,6.985) A9(3.175,6.985) A10(4.445,6.985) A11(5.715,6.985) A12(6.985,6.985) B1(-6.985,5.715) B2(-5.715,5.715) B3(-4.445,5.715) B4(-3.175,5.715) B5(-1.905,5.715) B6(-0.635,5.715) B7(0.635,5.715) B9(3.175,5.715) B11(5.715,5.715) B12(6.985,5.715) C1(-6.985,4.445) C2(-5.715,4.445) C3(-4.445,4.445) C4(-3.175,4.445) C5(-1.905,4.445) C6(-0.635,4.445) C7(0.635,4.445) C9(3.175,4.445) C10(4.445,4.445) C11(5.715,4.445) C12(6.985,4.445) D1(-6.985,3.175) D2(-5.715,3.175) D3(-4.445,3.175) D4(-3.175,3.175) D5(-1.905,3.175) D6(-0.635,3.175) D8(1.905,3.175) D9(3.175,3.175) D10(4.445,3.175) D11(5.715,3.175) D12(6.985,3.175) E1(-6.985,1.905) E2(-5.715,1.905) E3(-4.445,1.905) E4(-3.175,1.905) E5(-1.905,1.905) E6(-0.635,1.905) E7(0.635,1.905) E9(3.175,1.905) E12(6.985,1.905) F1(-6.985,0.635) F2(-5.715,0.635) F3(-4.445,0.635) F4(-3.175,0.635) F5(-1.905,0.635) F6(-0.635,0.635) F7(0.635,0.635) F8(1.905,0.635) F9(3.175,0.635) F11(5.715,0.635) F12(6.985,0.635) G1(-6.985,-0.635) G2(-5.715,-0.635) G3(-4.445,-0.635) G4(-3.175,-0.635) G5(-1.905,-0.635) G6(-0.635,-0.635) G7(0.635,-0.635) G8(1.905,-0.635) G9(3.175,-0.635) G11(5.715,-0.635) G12(6.985,-0.635) H1(-6.985,-1.905) H2(-5.715,-1.905) H3(-4.445,-1.905) H4(-3.175,-1.905) H5(-1.905,-1.905) H6(-0.635,-1.905) H7(0.635,-1.905) H8(1.905,-1.905) H9(3.175,-1.905) H11(5.715,-1.905) H12(6.985,-1.905) J1(-6.985,-3.175) J2(-5.715,-3.175) J3(-4.445,-3.175) J4(-3.175,-3.175) J5(-1.905,-3.175) J6(-0.635,-3.175) J7(0.635,-3.175) J8(1.905,-3.175) J9(3.175,-3.175) J10(4.445,-3.175) J12(6.985,-3.175) K1(-6.985,-4.445) K2(-5.715,-4.445) K3(-4.445,-4.445) K4(-3.175,-4.445) K5(-1.905,-4.445) K6(-0.635,-4.445) K7(0.635,-4.445) K8(1.905,-4.445) K9(3.175,-4.445) K10(4.445,-4.445) K11(5.715,-4.445) K12(6.985,-4.445) L1(-6.985,-5.715) L2(-5.715,-5.715) L3(-4.445,-5.715) L4(-3.175,-5.715) L5(-1.905,-5.715) L6(-0.635,-5.715) L7(0.635,-5.715) L8(1.905,-5.715) L9(3.175,-5.715) L10(4.445,-5.715) L11(5.715,-5.715) L12(6.985,-5.715) M1(-6.985,-6.985) M2(-5.715,-6.985) M3(-4.445,-6.985) M4(-3.175,-6.985) M5(-1.905,-6.985) M6(-0.635,-6.985) M7(0.635,-6.985) M8(1.905,-6.985) M9(3.175,-6.985) M10(4.445,-6.985) M11(5.715,-6.985) M12(6.985,-6.985)
Top Overlay:
  circle w0.25: c-8.3,7 r0.125
  lines w0.2: -7.7,-7.7 7.7,-7.7 7.7,7.7 -7.7,7.7 -7.7,-7.7
Mechanical 14:
  lines w0.1: -7.5,6.5 -6.5,7.5 ; -7.5,6.6 -6.6,7.5 ; -7.5,6.7 -6.7,7.5 ; -7.5,6.8 -6.8,7.5 ; -7.5,6.9 -6.9,7.5 ; -7.5,7 -7,7.5 ; -7.5,7.1 -7.1,7.5 ; -7.5,7.2 -7.2,7.5 ; -7.5,7.3 -7.3,7.5 ; -7.5,7.4 -7.4,7.5 ; -7.5,-7.5 7.5,-7.5 7.5,7.5 -7.5,7.5 -7.5,-7.5
  text "12" at 6.858,7.747 h0.4
  text "11" at 5.588,7.747 h0.4
  text "10" at 4.318,7.747 h0.4
  text "8" at 1.778,7.747 h0.4
  text "7" at 0.508,7.747 h0.4
  text "6" at -0.762,7.747 h0.4
  text "5" at -2.032,7.747 h0.4
  text "4" at -3.302,7.747 h0.4
  text "3" at -4.572,7.747 h0.4
  text "2" at -5.842,7.747 h0.4
  text "1" at -7.112,7.747 h0.4
  text "9" at 3.048,7.747 h0.4
  text "J" at -8.255,-3.302 h0.4
  text "A" at -8.255,6.858 h0.4
  text "B" at -8.255,5.588 h0.4
  text "C" at -8.255,4.318 h0.4
  text "D" at -8.255,3.048 h0.4
  text "E" at -8.255,1.778 h0.4
  text "F" at -8.255,0.508 h0.4
  text "G" at -8.255,-0.762 h0.4
  text "H" at -8.255,-2.032 h0.4
  text "K" at -8.255,-4.572 h0.4
  text "L" at -8.255,-5.842 h0.4
  text "M" at -8.255,-7.112 h0.4
Mechanical 15:
  circle w0.05: c0,0 r0.35
  lines w0.05: -0.5,0 0.5,0 ; 0,-0.5 0,0.5 ; -8.6,-8.6 8.6,-8.6 8.6,8.6 -8.6,8.6 -8.6,-8.6
3D body "LGA133S127P12X12_1500X1500X442.stp": height 4.42, standoff 0, extent -7.5,-7.5 7.5,7.5

## LGA144S127P12X12_1500X1500X292R [mm] "LGA,1.27mm pitch,square;144 pin,12 columns X 12 rows,15.00mm X 15.00mm X 2.92mm H (w/reversed pins)"
height 2.97
pads (144):
  round 0.65 smd: A1(-6.985,6.985)
  rect 0.65x0.65 smd: A2(-6.985,5.715) A3(-6.985,4.445) A4(-6.985,3.175) A5(-6.985,1.905) A6(-6.985,0.635) A7(-6.985,-0.635) A8(-6.985,-1.905) A9(-6.985,-3.175) A10(-6.985,-4.445) A11(-6.985,-5.715) A12(-6.985,-6.985) B1(-5.715,6.985) B2(-5.715,5.715) B3(-5.715,4.445) B4(-5.715,3.175) B5(-5.715,1.905) B6(-5.715,0.635) B7(-5.715,-0.635) B8(-5.715,-1.905) B9(-5.715,-3.175) B10(-5.715,-4.445) B11(-5.715,-5.715) B12(-5.715,-6.985) C1(-4.445,6.985) C2(-4.445,5.715) C3(-4.445,4.445) C4(-4.445,3.175) C5(-4.445,1.905) C6(-4.445,0.635) C7(-4.445,-0.635) C8(-4.445,-1.905) C9(-4.445,-3.175) C10(-4.445,-4.445) C11(-4.445,-5.715) C12(-4.445,-6.985) D1(-3.175,6.985) D2(-3.175,5.715) D3(-3.175,4.445) D4(-3.175,3.175) D5(-3.175,1.905) D6(-3.175,0.635) D7(-3.175,-0.635) D8(-3.175,-1.905) D9(-3.175,-3.175) D10(-3.175,-4.445) D11(-3.175,-5.715) D12(-3.175,-6.985) E1(-1.905,6.985) E2(-1.905,5.715) E3(-1.905,4.445) E4(-1.905,3.175) E5(-1.905,1.905) E6(-1.905,0.635) E7(-1.905,-0.635) E8(-1.905,-1.905) E9(-1.905,-3.175) E10(-1.905,-4.445) E11(-1.905,-5.715) E12(-1.905,-6.985) F1(-0.635,6.985) F2(-0.635,5.715) F3(-0.635,4.445) F4(-0.635,3.175) F5(-0.635,1.905) F6(-0.635,0.635) F7(-0.635,-0.635) F8(-0.635,-1.905) F9(-0.635,-3.175) F10(-0.635,-4.445) F11(-0.635,-5.715) F12(-0.635,-6.985) G1(0.635,6.985) G2(0.635,5.715) G3(0.635,4.445) G4(0.635,3.175) G5(0.635,1.905) G6(0.635,0.635) G7(0.635,-0.635) G8(0.635,-1.905) G9(0.635,-3.175) G10(0.635,-4.445) G11(0.635,-5.715) G12(0.635,-6.985) H1(1.905,6.985) H2(1.905,5.715) H3(1.905,4.445) H4(1.905,3.175) H5(1.905,1.905) H6(1.905,0.635) H7(1.905,-0.635) H8(1.905,-1.905) H9(1.905,-3.175) H10(1.905,-4.445) H11(1.905,-5.715) H12(1.905,-6.985) J1(3.175,6.985) J2(3.175,5.715) J3(3.175,4.445) J4(3.175,3.175) J5(3.175,1.905) J6(3.175,0.635) J7(3.175,-0.635) J8(3.175,-1.905) J9(3.175,-3.175) J10(3.175,-4.445) J11(3.175,-5.715) J12(3.175,-6.985) K1(4.445,6.985) K2(4.445,5.715) K3(4.445,4.445) K4(4.445,3.175) K5(4.445,1.905) K6(4.445,0.635) K7(4.445,-0.635) K8(4.445,-1.905) K9(4.445,-3.175) K10(4.445,-4.445) K11(4.445,-5.715) K12(4.445,-6.985) L1(5.715,6.985) L2(5.715,5.715) L3(5.715,4.445) L4(5.715,3.175) L5(5.715,1.905) L6(5.715,0.635) L7(5.715,-0.635) L8(5.715,-1.905) L9(5.715,-3.175) L10(5.715,-4.445) L11(5.715,-5.715) L12(5.715,-6.985) M1(6.985,6.985) M2(6.985,5.715) M3(6.985,4.445) M4(6.985,3.175) M5(6.985,1.905) M6(6.985,0.635) M7(6.985,-0.635) M8(6.985,-1.905) M9(6.985,-3.175) M10(6.985,-4.445) M11(6.985,-5.715) M12(6.985,-6.985)
Top Overlay:
  circle w0.25: c-8.425,7.775 r0.125
  lines w0.2: -7.7,-7.7 -7.7,7.7 7.7,7.7 7.7,-7.7 -7.7,-7.7
Mechanical 14:
  circle w0.25: c-8.425,7.775 r0.125
  lines w0.1: -7.5,6.5 -6.5,7.5 ; -7.5,6.6 -6.6,7.5 ; -7.5,6.7 -6.7,7.5 ; -7.5,6.8 -6.8,7.5 ; -7.5,6.9 -6.9,7.5 ; -7.5,7 -7,7.5 ; -7.5,7.1 -7.1,7.5 ; -7.5,7.2 -7.2,7.5 ; -7.5,7.3 -7.3,7.5 ; -7.5,7.4 -7.4,7.5 ; -7.5,-7.5 -7.5,7.5 7.5,7.5 7.5,-7.5 -7.5,-7.5
  text "12" at -8.255,-7.112 h0.4
  text "11" at -8.255,-5.842 h0.4
  text "10" at -8.255,-4.572 h0.4
  text "9" at -8.001,-3.302 h0.4
  text "8" at -8.001,-2.032 h0.4
  text "M" at 6.858,7.747 h0.4
  text "L" at 5.588,7.747 h0.4
  text "K" at 4.318,7.747 h0.4
  text "H" at 1.778,7.747 h0.4
  text "G" at 0.508,7.747 h0.4
  text "F" at -0.762,7.747 h0.4
  text "E" at -2.032,7.747 h0.4
  text "D" at -3.302,7.747 h0.4
  text "C" at -4.572,7.747 h0.4
  text "B" at -5.842,7.747 h0.4
  text "A" at -7.112,7.747 h0.4
  text "J" at 3.048,7.747 h0.4
  text "1" at -8.001,6.858 h0.4
  text "2" at -8.001,5.588 h0.4
  text "3" at -8.001,4.318 h0.4
  text "7" at -8.001,-0.762 h0.4
  text "4" at -8.001,3.048 h0.4
  text "5" at -8.001,1.778 h0.4
  text "6" at -8.001,0.508 h0.4
Mechanical 15:
  circle w0.05: c0,0 r0.35
  lines w0.05: -0.5,0 0.5,0 ; 0,-0.5 0,0.5 ; -9.5,-9.5 -9.5,9.5 9.5,9.5 9.5,-9.5 -9.5,-9.5
3D body "LGA144S127P12X12_1500X1500X292R.stp": height 2.92, standoff 0, extent -7.5,-7.5 7.5,7.5

## LGA144S127P12X12_1500X1500X442R [mm] "LGA, 1.27mm Pitch, Square; 144 Pin, 12 Columns X 12 Rows, 15.00mm X 15.00mm X 4.42mm H (w/Reversed Pins)"
height 4.42
pads (144):
  round 0.65 smd: A1(-6.985,6.985)
  rect 0.65x0.65 smd: A2(-6.985,5.715) A3(-6.985,4.445) A4(-6.985,3.175) A5(-6.985,1.905) A6(-6.985,0.635) A7(-6.985,-0.635) A8(-6.985,-1.905) A9(-6.985,-3.175) A10(-6.985,-4.445) A11(-6.985,-5.715) A12(-6.985,-6.985) B1(-5.715,6.985) B2(-5.715,5.715) B3(-5.715,4.445) B4(-5.715,3.175) B5(-5.715,1.905) B6(-5.715,0.635) B7(-5.715,-0.635) B8(-5.715,-1.905) B9(-5.715,-3.175) B10(-5.715,-4.445) B11(-5.715,-5.715) B12(-5.715,-6.985) C1(-4.445,6.985) C2(-4.445,5.715) C3(-4.445,4.445) C4(-4.445,3.175) C5(-4.445,1.905) C6(-4.445,0.635) C7(-4.445,-0.635) C8(-4.445,-1.905) C9(-4.445,-3.175) C10(-4.445,-4.445) C11(-4.445,-5.715) C12(-4.445,-6.985) D1(-3.175,6.985) D2(-3.175,5.715) D3(-3.175,4.445) D4(-3.175,3.175) D5(-3.175,1.905) D6(-3.175,0.635) D7(-3.175,-0.635) D8(-3.175,-1.905) D9(-3.175,-3.175) D10(-3.175,-4.445) D11(-3.175,-5.715) D12(-3.175,-6.985) E1(-1.905,6.985) E2(-1.905,5.715) E3(-1.905,4.445) E4(-1.905,3.175) E5(-1.905,1.905) E6(-1.905,0.635) E7(-1.905,-0.635) E8(-1.905,-1.905) E9(-1.905,-3.175) E10(-1.905,-4.445) E11(-1.905,-5.715) E12(-1.905,-6.985) F1(-0.635,6.985) F2(-0.635,5.715) F3(-0.635,4.445) F4(-0.635,3.175) F5(-0.635,1.905) F6(-0.635,0.635) F7(-0.635,-0.635) F8(-0.635,-1.905) F9(-0.635,-3.175) F10(-0.635,-4.445) F11(-0.635,-5.715) F12(-0.635,-6.985) G1(0.635,6.985) G2(0.635,5.715) G3(0.635,4.445) G4(0.635,3.175) G5(0.635,1.905) G6(0.635,0.635) G7(0.635,-0.635) G8(0.635,-1.905) G9(0.635,-3.175) G10(0.635,-4.445) G11(0.635,-5.715) G12(0.635,-6.985) H1(1.905,6.985) H2(1.905,5.715) H3(1.905,4.445) H4(1.905,3.175) H5(1.905,1.905) H6(1.905,0.635) H7(1.905,-0.635) H8(1.905,-1.905) H9(1.905,-3.175) H10(1.905,-4.445) H11(1.905,-5.715) H12(1.905,-6.985) J1(3.175,6.985) J2(3.175,5.715) J3(3.175,4.445) J4(3.175,3.175) J5(3.175,1.905) J6(3.175,0.635) J7(3.175,-0.635) J8(3.175,-1.905) J9(3.175,-3.175) J10(3.175,-4.445) J11(3.175,-5.715) J12(3.175,-6.985) K1(4.445,6.985) K2(4.445,5.715) K3(4.445,4.445) K4(4.445,3.175) K5(4.445,1.905) K6(4.445,0.635) K7(4.445,-0.635) K8(4.445,-1.905) K9(4.445,-3.175) K10(4.445,-4.445) K11(4.445,-5.715) K12(4.445,-6.985) L1(5.715,6.985) L2(5.715,5.715) L3(5.715,4.445) L4(5.715,3.175) L5(5.715,1.905) L6(5.715,0.635) L7(5.715,-0.635) L8(5.715,-1.905) L9(5.715,-3.175) L10(5.715,-4.445) L11(5.715,-5.715) L12(5.715,-6.985) M1(6.985,6.985) M2(6.985,5.715) M3(6.985,4.445) M4(6.985,3.175) M5(6.985,1.905) M6(6.985,0.635) M7(6.985,-0.635) M8(6.985,-1.905) M9(6.985,-3.175) M10(6.985,-4.445) M11(6.985,-5.715) M12(6.985,-6.985)
Top Overlay:
  circle w0.25: c-8.3,7 r0.125
  lines w0.2: -7.7,-7.7 -7.7,7.7 7.7,7.7 7.7,-7.7 -7.7,-7.7
Mechanical 14:
  lines w0.1: -7.5,6.5 -6.5,7.5 ; -7.5,6.6 -6.6,7.5 ; -7.5,6.7 -6.7,7.5 ; -7.5,6.8 -6.8,7.5 ; -7.5,6.9 -6.9,7.5 ; -7.5,7 -7,7.5 ; -7.5,7.1 -7.1,7.5 ; -7.5,7.2 -7.2,7.5 ; -7.5,7.3 -7.3,7.5 ; -7.5,7.4 -7.4,7.5 ; -7.5,-7.5 -7.5,7.5 7.5,7.5 7.5,-7.5 -7.5,-7.5
  text "6" at -8.001,0.508 h0.4
  text "5" at -8.001,1.778 h0.4
  text "4" at -8.001,3.048 h0.4
  text "7" at -8.001,-0.762 h0.4
  text "3" at -8.001,4.318 h0.4
  text "2" at -8.001,5.588 h0.4
  text "1" at -8.001,6.858 h0.4
  text "8" at -8.001,-2.032 h0.4
  text "9" at -8.001,-3.302 h0.4
  text "10" at -8.255,-4.572 h0.4
  text "11" at -8.255,-5.842 h0.4
  text "12" at -8.255,-7.112 h0.4
  text "J" at 3.048,7.747 h0.4
  text "A" at -7.112,7.747 h0.4
  text "B" at -5.842,7.747 h0.4
  text "C" at -4.572,7.747 h0.4
  text "D" at -3.302,7.747 h0.4
  text "E" at -2.032,7.747 h0.4
  text "F" at -0.762,7.747 h0.4
  text "G" at 0.508,7.747 h0.4
  text "H" at 1.778,7.747 h0.4
  text "K" at 4.318,7.747 h0.4
  text "L" at 5.588,7.747 h0.4
  text "M" at 6.858,7.747 h0.4
Mechanical 15:
  circle w0.05: c0,0 r0.35
  lines w0.05: -0.5,0 0.5,0 ; 0,-0.5 0,0.5 ; -8.6,-8.6 -8.6,8.6 8.6,8.6 8.6,-8.6 -8.6,-8.6
3D body "LGA144S127P12X12_1500X1500X442R.stp": height 4.42, standoff 0, extent -7.5,-7.5 7.5,7.5

## LINEAR_DE12(10) [mm] "SON, 0.50mm pitch; 10 pin, 3.00mm W X 4.00mm L X 0.80mm H body (w/thermal tab 0.25 X3.65mm), LINEAR DE12(10) Package"
height 0.8
pads (11):
  rect 0.8x0.3 smd: 1(-1.4,1.25)
  rect 0.75x0.3 smd: 3(-1.425,0.25) 5(-1.425,-0.75) 6(-1.425,-1.25) 7(1.425,-1.25) 8(1.425,-0.75) 9(1.425,-0.25) 10(1.425,0.25) 11(1.425,0.75) 12(1.425,1.25)
  rect 0.25x3.65 smd: 13(0,0)
Top Overlay:
  circle w0.25: c-2.35,1.25 r0.125
  lines w0.2: -1.5,-1.75 -1.5,-2 -0.5,-2 ; -1.5,1.75 -1.5,2 -0.5,2 ; 0.5,-2 1.5,-2 1.5,-1.75 ; 0.5,2 1.5,2 1.5,1.75
Mechanical 8:
  lines w0.05: -1.8,-1.4 -1.425,-1.25 -1.8,-1.1 ; -1.8,-1.4 -1.8,-1.1 ; -1.8,-1.4 -1.05,-1.4 -1.05,-1.1 -1.8,-1.1 ; -1.8,-0.9 -1.425,-0.75 -1.8,-0.6 ; -1.8,-0.9 -1.8,-0.6 ; -1.8,-0.9 -1.05,-0.9 -1.05,-0.6 -1.8,-0.6 ; -1.8,0.1 -1.425,0.25 -1.8,0.4 ; -1.8,0.1 -1.8,0.4 ; -1.8,0.1 -1.05,0.1 -1.05,0.4 -1.8,0.4 ; -1.8,1.1 -1.4,1.25 -1.8,1.4 ; -1.8,1.1 -1.8,1.4 ; -1.8,1.1 -1,1.1 -1,1.4 -1.8,1.4 ; 1.8,-1.4 1.425,-1.25 1.8,-1.1 ; 1.8,-1.4 1.8,-1.1 ; 1.8,-1.4 1.05,-1.4 1.05,-1.1 1.8,-1.1 ; 1.8,-0.9 1.425,-0.75 1.8,-0.6 ; 1.8,-0.9 1.8,-0.6 ; 1.8,-0.9 1.05,-0.9 1.05,-0.6 1.8,-0.6 ; 1.8,-0.4 1.425,-0.25 1.8,-0.1 ; 1.8,-0.4 1.8,-0.1 ; 1.8,-0.4 1.05,-0.4 1.05,-0.1 1.8,-0.1 ; 1.8,0.1 1.425,0.25 1.8,0.4 ; 1.8,0.1 1.8,0.4 ; 1.8,0.1 1.05,0.1 1.05,0.4 1.8,0.4 ; 1.8,0.6 1.425,0.75 1.8,0.9 ; 1.8,0.6 1.8,0.9 ; 1.8,0.6 1.05,0.6 1.05,0.9 1.8,0.9 ; 1.8,1.1 1.425,1.25 1.8,1.4 ; 1.8,1.1 1.8,1.4 ; 1.8,1.1 1.05,1.1 1.05,1.4 1.8,1.4
Mechanical 14:
  lines w0.1: -1.5,1 -0.5,2 ; -1.5,1.1 -0.6,2 ; -1.5,1.2 -0.7,2 ; -1.5,1.3 -0.8,2 ; -1.5,1.4 -0.9,2 ; -1.5,1.5 -1,2 ; -1.5,1.6 -1.1,2 ; -1.5,1.7 -1.2,2 ; -1.5,1.8 -1.3,2 ; -1.5,1.9 -1.4,2 ; -1.5,-2 1.5,-2 1.5,2 -1.5,2 -1.5,-2
Mechanical 15:
  circle w0.05: c0,0 r0.35
  lines w0.05: -0.5,0 0.5,0 ; 0,-0.5 0,0.5 ; -2.15,-2.3 2.15,-2.3 2.15,2.3 -2.15,2.3 -2.15,-2.3
3D body "LINEAR_DE12(10).stp": height 0.8, standoff 0, extent -1.55,-2.05 1.55,2.05